# Altium footprint library SOURIAU THD.PcbLib: 34 footprints (part 3 of 5)
Each footprint in its own frame and in the unit in brackets; x right, y up, seen from the top. Pads: shape width x height; smd on the part's side, far side on the other; paste and mask are expansions set on the pad; w line width, h text height; cw(c..) or ccw(c..) is an arc to the next point about the centre after c.
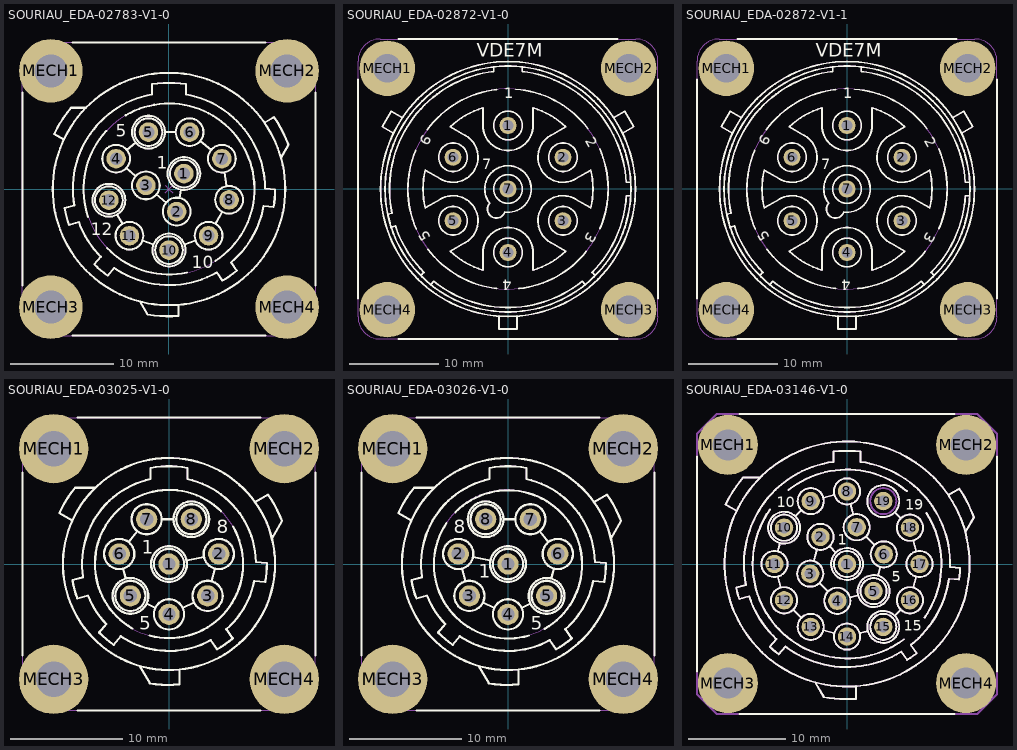
[diagram p2: the footprints below, top view; thin cyan lines are the x and y axes]

## SOURIAU_EDA-02783-V1-0 [mm] "SOURIAU UTO01412P21T Adapter Kit For PCB Mount, 12 Poles, Shell Size 14, UT Bantam Circular Male Connector"
height 33.3
pads (16):
  round 1.9 hole 1.2: 1(1.45,1.5) 2(0.75,-2.2) 3(-2.25,0.35) 4(-5.15,2.95) 5(-2,5.533) 6(2,5.533) 7(5.15,2.95) 8(5.85,-1.05) 9(3.85,-4.55) 10(0,-5.95) 11(-3.85,-4.55) 12(-5.85,-1.09)
  round 6.2 hole 3.2: MECH1(-11.505,11.505) MECH2(11.505,11.505) MECH3(-11.505,-11.505) MECH4(11.505,-11.505)
Top Overlay:
  circle w0.2: c0,0 r11.317
  circle w0.2: c-3.85,-4.55 r1.35
  circle w0.2: c3.85,-4.55 r1.35
  circle w0.2: c5.85,-1.05 r1.35
  circle w0.2: c5.15,2.95 r1.35
  circle w0.2: c2,5.533 r1.35
  circle w0.2: c-5.15,2.95 r1.35
  circle w0.2: c-2.25,0.35 r1.35
  circle w0.2: c0.75,-2.2 r1.35
  circle w0.2: c-5.85,-1.09 r1.35
  circle w0.2: c-5.85,-1.09 r1.6
  circle w0.2: c0,-5.95 r1.35
  circle w0.2: c0,-5.95 r1.6
  circle w0.2: c-2,5.533 r1.35
  circle w0.2: c-2,5.533 r1.6
  circle w0.2: c1.45,1.5 r1.35
  circle w0.2: c1.45,1.5 r1.6
  lines w0.2: -14.285,-9.379 -14.285,9.379 ; -10.239,4.82 -11.176,5.361 cw(c0,0) -9.541,7.913 -8.091,7.913 ; -9.379,-14.285 9.379,-14.285 ; -9.379,14.285 9.379,14.285 ; -7.872,-2.709 cw(c0,0) -6.106,5.659 ; -6.043,-5.727 ccw(c0,0) 1.759,-8.137 ; -5.049,-2.475 -4.526,-3.381 ; -4.212,7.181 cw(c0,0) 4.524,-6.988 ; -4.145,2.049 -3.255,1.251 ; -4.106,3.806 -3.237,4.519 ; -2.807,-10.963 -2.082,-12.219 ccw(c0,0) 0.945,-12.359 0.945,-11.277 ; -2.581,-5.011 -1.504,-5.403 ; -1.221,-0.524 -0.279,-1.326 ; -0.4,5.533 0.65,5.533 ; 1.001,-0.874 1.153,-0.072 ; 1.504,-5.403 2.581,-5.011 ; 3.044,4.677 4.106,3.806 ; 4.52,-3.378 5.18,-2.222 ; 5.383,1.62 5.617,0.28 ; 9.294,6.457 10.231,6.998 cw(c0,0) 11.623,4.306 10.898,3.05 ; 14.285,-9.379 14.285,9.379 ; -10.169,-1.845 ccw(c0,0) -9.729,-3.487 -8.784,-3.234 ccw(c0,0) -6.643,-6.594 -7.272,-7.344 ccw(c0,0) -5.97,-8.437 -5.34,-7.687 ccw(c0,0) 4.65,-8.123 5.212,-8.925 ccw(c0,0) 6.604,-7.95 6.043,-7.148 ccw(c0,0) 9.212,-1.659 10.187,-1.744 ccw(c0,0) 10.335,-0.051 9.36,0.034 ccw(c0,0) 1.65,9.213 1.65,10.202 ccw(c0,0) -1.65,10.202 -1.65,9.213 ccw(c0,0) -9.224,-1.592 -10.169,-1.845
  text "12" at -7.6,-4.5 h1.2
  text "10" at 2.2,-7.7 h1.2
  text "5" at -5.2,5.1 h1.2
  text "1" at -1.172,1.961 h1.2
Mechanical 8:
  lines w0.1: -12.005,-11.505 -11.505,-11.505 ; -12.005,11.505 -11.505,11.505 ; -11.505,-12.005 -11.505,-11.505 ; -11.505,-11.005 -11.505,-11.505 ; -11.505,11.005 -11.505,11.505 ; -11.505,12.005 -11.505,11.505 ; -11.005,-11.505 -11.505,-11.505 ; -11.005,11.505 -11.505,11.505 ; -6.35,-1.09 -5.85,-1.09 ; -5.85,-1.59 -5.85,-1.09 ; -5.85,-0.59 -5.85,-1.09 ; -5.65,2.95 -5.15,2.95 ; -5.35,-1.09 -5.85,-1.09 ; -5.15,2.45 -5.15,2.95 ; -5.15,3.45 -5.15,2.95 ; -4.65,2.95 -5.15,2.95 ; -4.35,-4.55 -3.85,-4.55 ; -3.85,-5.05 -3.85,-4.55 ; -3.85,-4.05 -3.85,-4.55 ; -3.35,-4.55 -3.85,-4.55 ; -2.75,0.35 -2.25,0.35 ; -2.5,5.533 -2,5.533 ; -2.25,-0.15 -2.25,0.35 ; -2.25,0.85 -2.25,0.35 ; -2,5.033 -2,5.533 ; -2,6.033 -2,5.533 ; -1.75,0.35 -2.25,0.35 ; -1.5,5.533 -2,5.533 ; -0.5,-5.95 0,-5.95 ; -0.354,-0.354 0,0 ; -0.354,0.354 0,0 ; 0,-6.45 0,-5.95 ; 0,-5.45 0,-5.95 ; 0.25,-2.2 0.75,-2.2 ; 0.354,-0.354 0,0 ; 0.354,0.354 0,0 ; 0.5,-5.95 0,-5.95 ; 0.75,-2.7 0.75,-2.2 ; 0.75,-1.7 0.75,-2.2 ; 0.95,1.5 1.45,1.5 ; 1.25,-2.2 0.75,-2.2 ; 1.45,1 1.45,1.5 ; 1.45,2 1.45,1.5 ; 1.5,5.533 2,5.533 ; 1.95,1.5 1.45,1.5 ; 2,5.033 2,5.533 ; 2,6.033 2,5.533 ; 2.5,5.533 2,5.533 ; 3.35,-4.55 3.85,-4.55 ; 3.85,-5.05 3.85,-4.55 ; 3.85,-4.05 3.85,-4.55 ; 4.35,-4.55 3.85,-4.55 ; 4.65,2.95 5.15,2.95 ; 5.15,2.45 5.15,2.95 ; 5.15,3.45 5.15,2.95 ; 5.35,-1.05 5.85,-1.05 ; 5.65,2.95 5.15,2.95 ; 5.85,-1.55 5.85,-1.05 ; 5.85,-0.55 5.85,-1.05 ; 6.35,-1.05 5.85,-1.05 ; 11.005,-11.505 11.505,-11.505 ; 11.005,11.505 11.505,11.505 ; 11.505,-12.005 11.505,-11.505 ; 11.505,-11.005 11.505,-11.505 ; 11.505,11.005 11.505,11.505 ; 11.505,12.005 11.505,11.505 ; 12.005,-11.505 11.505,-11.505 ; 12.005,11.505 11.505,11.505
Mechanical 14:
  circle w0.1: c-3.85,-4.55 r1.35
  circle w0.1: c3.85,-4.55 r1.35
  circle w0.1: c5.85,-1.05 r1.35
  circle w0.1: c5.15,2.95 r1.35
  circle w0.1: c2,5.533 r1.35
  circle w0.1: c-5.15,2.95 r1.35
  circle w0.1: c-2.25,0.35 r1.35
  circle w0.1: c0.75,-2.2 r1.35
  circle w0.1: c-5.85,-1.09 r1.6
  circle w0.1: c-5.85,-1.09 r1.35
  circle w0.1: c0,-5.95 r1.6
  circle w0.1: c0,-5.95 r1.35
  circle w0.1: c-2,5.533 r1.6
  circle w0.1: c-2,5.533 r1.35
  circle w0.1: c1.45,1.5 r1.6
  circle w0.1: c1.45,1.5 r1.35
  circle w0.1: c0,0 r8.325
  circle w0.1: c0,0 r11.317
  circle w0.1: c-11.505,-11.505 r2.8
  circle w0.1: c11.505,-11.505 r2.8
  circle w0.1: c11.505,11.505 r2.8
  circle w0.1: c-11.505,11.505 r2.8
  lines w0.1: -14.285,-11.839 -14.285,-12.603 -13.844,-13.044 ; -14.285,-11.171 -14.285,11.171 ; -14.285,11.839 -14.285,12.603 -13.844,13.044 ; -13.044,-13.844 -12.603,-14.285 -11.839,-14.285 ; -13.044,13.844 -12.603,14.285 -11.839,14.285 ; -11.171,-14.285 11.171,-14.285 ; -11.171,14.285 11.171,14.285 ; -10.239,4.82 -11.176,5.361 cw(c0,0) -9.541,7.913 -8.091,7.913 ; -5.049,-2.475 -4.526,-3.381 ; -4.145,2.049 -3.255,1.251 ; -4.106,3.806 -3.237,4.519 ; -2.807,-10.963 -2.082,-12.219 ccw(c0,0) 0.945,-12.359 0.945,-11.277 ; -2.581,-5.011 -1.504,-5.403 ; -1.221,-0.524 -0.279,-1.326 ; -0.4,5.533 0.65,5.533 ; 1.001,-0.874 1.153,-0.072 ; 1.504,-5.403 2.581,-5.011 ; 3.044,4.677 4.106,3.806 ; 4.52,-3.378 5.18,-2.222 ; 5.383,1.62 5.617,0.28 ; 9.294,6.457 10.231,6.998 cw(c0,0) 11.623,4.306 10.898,3.05 ; 11.839,-14.285 12.603,-14.285 13.044,-13.844 ; 11.839,14.285 12.603,14.285 13.044,13.844 ; 13.844,-13.044 14.285,-12.603 14.285,-11.839 ; 13.844,13.044 14.285,12.603 14.285,11.839 ; 14.285,-11.171 14.285,11.171 ; -12.667,-11.861 ccw(c-12.475,-12.065) -12.395,-12.333 cw(c-12.254,-12.803) -11.777,-12.69 ccw(c-11.505,-12.625) -11.233,-12.69 cw(c-10.756,-12.803) -10.615,-12.333 ccw(c-10.535,-12.065) -10.343,-11.861 cw(c-10.007,-11.505) -10.343,-11.149 ccw(c-10.535,-10.945) -10.615,-10.677 cw(c-10.756,-10.207) -11.233,-10.32 ccw(c-11.505,-10.385) -11.777,-10.32 cw(c-12.254,-10.207) -12.395,-10.677 ccw(c-12.475,-10.945) -12.667,-11.149 cw(c-13.003,-11.505) -12.667,-11.861 ; -12.667,11.149 ccw(c-12.475,10.945) -12.395,10.677 cw(c-12.254,10.207) -11.777,10.32 ccw(c-11.505,10.385) -11.233,10.32 cw(c-10.756,10.207) -10.615,10.677 ccw(c-10.535,10.945) -10.343,11.149 cw(c-10.007,11.505) -10.343,11.861 ccw(c-10.535,12.065) -10.615,12.333 cw(c-10.756,12.803) -11.233,12.69 ccw(c-11.505,12.625) -11.777,12.69 cw(c-12.254,12.803) -12.395,12.333 ccw(c-12.475,12.065) -12.667,11.861 cw(c-13.003,11.505) -12.667,11.149 ; -10.169,-1.845 ccw(c0,0) -9.729,-3.487 -8.784,-3.234 ccw(c0,0) -6.643,-6.594 -7.272,-7.344 ccw(c0,0) -5.97,-8.437 -5.34,-7.687 ccw(c0,0) 4.65,-8.123 5.212,-8.925 ccw(c0,0) 6.604,-7.95 6.043,-7.148 ccw(c0,0) 9.212,-1.659 10.187,-1.744 ccw(c0,0) 10.335,-0.051 9.36,0.034 ccw(c0,0) 1.65,9.213 1.65,10.202 ccw(c0,0) -1.65,10.202 -1.65,9.213 ccw(c0,0) -9.224,-1.592 -10.169,-1.845 ; 10.343,-11.861 ccw(c10.535,-12.065) 10.615,-12.333 cw(c10.756,-12.803) 11.233,-12.69 ccw(c11.505,-12.625) 11.777,-12.69 cw(c12.254,-12.803) 12.395,-12.333 ccw(c12.475,-12.065) 12.667,-11.861 cw(c13.003,-11.505) 12.667,-11.149 ccw(c12.475,-10.945) 12.395,-10.677 cw(c12.254,-10.207) 11.777,-10.32 ccw(c11.505,-10.385) 11.233,-10.32 cw(c10.756,-10.207) 10.615,-10.677 ccw(c10.535,-10.945) 10.343,-11.149 cw(c10.007,-11.505) 10.343,-11.861 ; 10.343,11.149 ccw(c10.535,10.945) 10.615,10.677 cw(c10.756,10.207) 11.233,10.32 ccw(c11.505,10.385) 11.777,10.32 cw(c12.254,10.207) 12.395,10.677 ccw(c12.475,10.945) 12.667,11.149 cw(c13.003,11.505) 12.667,11.861 ccw(c12.475,12.065) 12.395,12.333 cw(c12.254,12.803) 11.777,12.69 ccw(c11.505,12.625) 11.233,12.69 cw(c10.756,12.803) 10.615,12.333 ccw(c10.535,12.065) 10.343,11.861 cw(c10.007,11.505) 10.343,11.149
  text "11" at -4.45,-5.15 h1.2
  text "9" at 3.479,-5.15 h1.2
  text "8" at 5.45,-1.65 h1.2
  text "7" at 4.75,2.35 h1.2
  text "6" at 1.629,4.933 h1.2
  text "4" at -5.579,2.35 h1.2
  text "3" at -2.65,-0.25 h1.2
  text "2" at 0.35,-2.8 h1.2
  text "12" at -6.707,-1.69 h1.2
  text "10" at -0.857,-6.55 h1.2
  text "5" at -2.4,4.933 h1.2
  text "1" at 1.307,0.9 h1.2
3D body "SOURIAU_EDA-02783-V1-0.stp": height 32.93, standoff -14.87, extent -14.605,-14.598 14.605,14.599

## SOURIAU_EDA-02872-V1-0 [mm] "SOURIAU UTG0187PVDEX Connector VDE 7 Male Contacts Mounted On 20mm M3 Spacer"
height 40.75
pads (11):
  round 1.9 hole 1.2: 1(0,7.1) 2(6.149,3.55) 3(6.149,-3.55) 4(0,-7.1) 5(-6.149,-3.55) 6(-6.149,3.55) 7(0,0)
  round 6.2 hole 3.2: MECH1(-13.5,13.5) MECH2(13.5,13.5) MECH3(13.5,-13.5) MECH4(-13.5,-13.5)
Top Overlay:
  circle w0.2: c0,0 r13.75
  circle w0.2: c0,0 r14.25
  circle w0.2: c-6.149,3.55 r1.6
  circle w0.2: c0,7.1 r1.6
  circle w0.2: c6.149,3.55 r1.6
  circle w0.2: c0,0 r1.6
  circle w0.2: c6.149,-3.55 r1.6
  circle w0.2: c0,-7.1 r1.6
  circle w0.2: c-6.149,-3.55 r1.6
  lines w0.2: -16.775,-12.265 -16.775,12.265 ; -13.456,-2.829 -12.972,-2.699 cw(c0,0) -1.6,13.153 -1.6,13.657 ; -13.068,-4.278 -12.584,-4.148 ccw(c0,0) -9.409,-9.329 -9.744,-9.701 ; -12.81,6.241 -14.053,6.959 -13.053,8.691 -11.81,7.973 ; -12.265,-16.775 12.265,-16.775 ; -12.265,16.775 12.265,16.775 ; -10.332,4.324 ccw(c0,0) -10.265,-4.48 ; -9.034,6.62 cw(c0,0) -1.262,11.129 ; -8.951,-6.732 ccw(c0,0) -1.262,-11.129 ; -8.629,-10.705 -8.294,-10.333 ccw(c0,0) 8.294,-10.333 8.629,-10.705 ; -1,-14.215 -1,-15.65 1,-15.65 1,-14.215 ; 0.875,11.166 cw(c0,0) 8.921,6.772 ; 1.229,-11.132 ccw(c0,0) 8.761,-6.977 ; 1.6,13.657 1.6,13.153 cw(c0,0) 13.229,0.75 13.73,0.75 ; 9.744,-9.701 9.409,-9.329 ccw(c0,0) 13.229,-0.75 13.73,-0.75 ; 10.254,4.506 cw(c0,0) 10.292,-4.418 ; 11.81,7.973 13.053,8.691 14.053,6.959 12.81,6.241 ; 16.775,-12.265 16.775,12.265 ; -9.262,-2.114 cw(c0,0) -9.262,2.114 -7.549,1.125 ccw(c-6.149,3.55) -4.749,5.975 -6.462,6.964 cw(c0,0) -2.8,9.078 -2.8,7.1 ccw(c0,7.1) 2.8,7.1 2.8,9.078 cw(c0,0) 6.462,6.964 4.749,5.975 ccw(c6.149,3.55) 7.549,1.125 9.262,2.114 cw(c0,0) 9.262,-2.114 7.549,-1.125 ccw(c6.149,-3.55) 4.749,-5.975 6.462,-6.964 cw(c0,0) 2.8,-9.078 2.8,-7.1 ccw(c0,-7.1) -2.8,-7.1 -2.8,-9.078 cw(c0,0) -6.462,-6.964 -4.749,-5.975 ccw(c-6.149,-3.55) -7.549,-1.125 -9.262,-2.114 ; -2.054,-1.594 cw(c0,0) -0.354,-2.576 cw(c-1.3,-2.252) -2.054,-1.594
  text "7" at -2.9,2.2 h1.2
  text "6" at -8.975,4.703 h1.2
  text "5" at -8.56,-5.421 h1.2
  text "4" at 0.415,-10.124 h1.2
  text "3" at 8.975,-4.703 h1.2
  text "2" at 8.56,5.421 h1.2
  text "1" at -0.415,10.124 h1.2
  text "VDE7M" at -3.5,14.8 h1.5
Mechanical 8:
  lines w0.1: -14,-13.5 -13.5,-13.5 ; -14,13.5 -13.5,13.5 ; -13.5,-14 -13.5,-13.5 ; -13.5,-13 -13.5,-13.5 ; -13.5,13 -13.5,13.5 ; -13.5,14 -13.5,13.5 ; -13,-13.5 -13.5,-13.5 ; -13,13.5 -13.5,13.5 ; -6.582,-3.8 -6.149,-3.55 ; -6.582,3.8 -6.149,3.55 ; -6.399,-3.117 -6.149,-3.55 ; -6.399,3.117 -6.149,3.55 ; -5.899,-3.983 -6.149,-3.55 ; -5.899,3.983 -6.149,3.55 ; -5.716,-3.3 -6.149,-3.55 ; -5.716,3.3 -6.149,3.55 ; -0.5,-7.1 0,-7.1 ; -0.5,0 0,0 ; -0.5,7.1 0,7.1 ; 0,-7.6 0,-7.1 ; 0,-6.6 0,-7.1 ; 0,-0.5 0,0 ; 0,0.5 0,0 ; 0,6.6 0,7.1 ; 0,7.6 0,7.1 ; 0.5,-7.1 0,-7.1 ; 0.5,0 0,0 ; 0.5,7.1 0,7.1 ; 5.716,-3.3 6.149,-3.55 ; 5.716,3.3 6.149,3.55 ; 5.899,-3.983 6.149,-3.55 ; 5.899,3.983 6.149,3.55 ; 6.399,-3.117 6.149,-3.55 ; 6.399,3.117 6.149,3.55 ; 6.582,-3.8 6.149,-3.55 ; 6.582,3.8 6.149,3.55 ; 13,-13.5 13.5,-13.5 ; 13,13.5 13.5,13.5 ; 13.5,-14 13.5,-13.5 ; 13.5,-13 13.5,-13.5 ; 13.5,13 13.5,13.5 ; 13.5,14 13.5,13.5 ; 14,-13.5 13.5,-13.5 ; 14,13.5 13.5,13.5
Mechanical 14:
  circle w0.1: c0,0 r11.2
  circle w0.1: c0,0 r13.75
  circle w0.1: c0,0 r14.25
  circle w0.1: c-6.149,3.55 r1.6
  circle w0.1: c0,7.1 r1.6
  circle w0.1: c6.149,3.55 r1.6
  circle w0.1: c0,0 r1.6
  circle w0.1: c6.149,-3.55 r1.6
  circle w0.1: c0,-7.1 r1.6
  circle w0.1: c-6.149,-3.55 r1.6
  circle w0.1: c-13.5,13.5 r2.8
  circle w0.1: c13.5,13.5 r2.8
  circle w0.1: c-13.5,-13.5 r2.8
  circle w0.1: c13.5,-13.5 r2.8
  lines w0.1: -13.456,-2.829 -12.972,-2.699 cw(c0,0) -1.6,13.153 -1.6,13.657 ; -13.235,-12.291 ccw(c-13.501,-12.382) -13.78,-12.343 cw(c-14.249,-12.202) -14.39,-12.672 ccw(c-14.47,-12.941) -14.642,-13.164 cw(c-14.998,-13.5) -14.662,-13.856 ccw(c-14.47,-14.06) -14.39,-14.328 cw(c-14.249,-14.798) -13.772,-14.685 ccw(c-13.5,-14.62) -13.222,-14.657 ; -13.235,14.709 ccw(c-13.501,14.618) -13.78,14.657 cw(c-14.249,14.798) -14.39,14.328 ccw(c-14.47,14.059) -14.642,13.836 cw(c-14.998,13.5) -14.662,13.144 ccw(c-14.47,12.94) -14.39,12.672 cw(c-14.249,12.202) -13.772,12.315 ccw(c-13.5,12.38) -13.222,12.343 ; -13.228,-12.315 ccw(c-12.751,-12.202) -12.638,-12.679 ; -13.228,14.685 ccw(c-12.751,14.798) -12.638,14.321 ; -13.22,-14.657 cw(c-12.755,-14.794) -12.577,-14.343 ; -13.22,12.343 cw(c-12.755,12.206) -12.577,12.657 ; -13.068,-4.278 -12.584,-4.148 ccw(c0,0) -9.409,-9.329 -9.744,-9.701 ; -12.81,6.241 -14.053,6.959 -13.053,8.691 -11.81,7.973 ; -12.637,-12.681 cw(c-12.53,-12.94) -12.32,-13.125 ; -12.637,14.319 cw(c-12.53,14.06) -12.32,13.875 ; -12.586,-14.334 ccw(c-12.531,-14.058) -12.358,-13.836 cw(c-12.002,-13.5) -12.35,-13.155 ; -12.586,12.666 ccw(c-12.531,12.942) -12.358,13.164 cw(c-12.002,13.5) -12.35,13.845 ; -8.629,-10.705 -8.294,-10.333 ccw(c0,0) 8.294,-10.333 8.629,-10.705 ; -1,-14.215 -1,-15.65 1,-15.65 1,-14.215 ; 1.6,13.657 1.6,13.153 cw(c0,0) 13.229,0.75 13.73,0.75 ; 9.744,-9.701 9.409,-9.329 ccw(c0,0) 13.229,-0.75 13.73,-0.75 ; 11.81,7.973 13.053,8.691 14.053,6.959 12.81,6.241 ; 13.765,-12.291 ccw(c13.499,-12.382) 13.22,-12.343 cw(c12.751,-12.202) 12.61,-12.672 ccw(c12.53,-12.941) 12.358,-13.164 cw(c12.002,-13.5) 12.338,-13.856 ccw(c12.53,-14.06) 12.61,-14.328 cw(c12.751,-14.798) 13.228,-14.685 ccw(c13.5,-14.62) 13.778,-14.657 ; 13.765,14.709 ccw(c13.499,14.618) 13.22,14.657 cw(c12.751,14.798) 12.61,14.328 ccw(c12.53,14.059) 12.358,13.836 cw(c12.002,13.5) 12.338,13.144 ccw(c12.53,12.94) 12.61,12.672 cw(c12.751,12.202) 13.228,12.315 ccw(c13.5,12.38) 13.778,12.343 ; 13.772,-12.315 ccw(c14.249,-12.202) 14.362,-12.679 ; 13.772,14.685 ccw(c14.249,14.798) 14.362,14.321 ; 13.78,-14.657 cw(c14.245,-14.794) 14.423,-14.343 ; 13.78,12.343 cw(c14.245,12.206) 14.423,12.657 ; 14.363,-12.681 cw(c14.47,-12.94) 14.68,-13.125 ; 14.363,14.319 cw(c14.47,14.06) 14.68,13.875 ; 14.414,-14.334 ccw(c14.469,-14.058) 14.642,-13.836 cw(c14.998,-13.5) 14.65,-13.155 ; 14.414,12.666 ccw(c14.469,12.942) 14.642,13.164 cw(c14.998,13.5) 14.65,13.845 ; -16.775,-14.275 ccw(c-14.275,-14.275) -14.275,-16.775 14.275,-16.775 ccw(c14.275,-14.275) 16.775,-14.275 16.775,14.275 ccw(c14.275,14.275) 14.275,16.775 -14.275,16.775 ccw(c-14.275,14.275) -16.775,14.275 -16.775,-14.275 ; -9.262,-2.114 cw(c0,0) -9.262,2.114 -7.549,1.125 ccw(c-6.149,3.55) -4.749,5.975 -6.462,6.964 cw(c0,0) -2.8,9.078 -2.8,7.1 ccw(c0,7.1) 2.8,7.1 2.8,9.078 cw(c0,0) 6.462,6.964 4.749,5.975 ccw(c6.149,3.55) 7.549,1.125 9.262,2.114 cw(c0,0) 9.262,-2.114 7.549,-1.125 ccw(c6.149,-3.55) 4.749,-5.975 6.462,-6.964 cw(c0,0) 2.8,-9.078 2.8,-7.1 ccw(c0,-7.1) -2.8,-7.1 -2.8,-9.078 cw(c0,0) -6.462,-6.964 -4.749,-5.975 ccw(c-6.149,-3.55) -7.549,-1.125 -9.262,-2.114 ; -2.054,-1.594 cw(c0,0) -0.354,-2.576 cw(c-1.3,-2.252) -2.054,-1.594
  text "7" at -0.667,-1 h2
  text "1" at -0.238,6.1 h2
  text "2" at 5.482,2.55 h2
  text "3" at 5.482,-4.55 h2
  text "4" at -0.714,-8.1 h2
  text "5" at -6.815,-4.55 h2
  text "6" at -6.768,2.55 h2
  text "7" at -0.667,-1 h2
  text "VDE7M" at -3.5,14.8 h1.5
3D body "SOURIAU_EDA-02872-V1-0.stp": height 40.6, standoff -7.9, extent -16.775,-16.775 16.775,16.775

## SOURIAU_EDA-02872-V1-1 [mm] "SOURIAU UTG0187PVDEX Connector VDE 7 Male Contacts Mounted On 20mm M3 Spacer"
height 35.75
pads (11):
  round 1.9 hole 1.2: 1(0,7.1) 2(6.149,3.55) 3(6.149,-3.55) 4(0,-7.1) 5(-6.149,-3.55) 6(-6.149,3.55) 7(0,0)
  round 6.2 hole 3.2: MECH1(-13.5,13.5) MECH2(13.5,13.5) MECH3(13.5,-13.5) MECH4(-13.5,-13.5)
Top Overlay:
  circle w0.2: c-6.149,-3.55 r1.6
  circle w0.2: c0,-7.1 r1.6
  circle w0.2: c6.149,-3.55 r1.6
  circle w0.2: c0,0 r1.6
  circle w0.2: c6.149,3.55 r1.6
  circle w0.2: c0,7.1 r1.6
  circle w0.2: c-6.149,3.55 r1.6
  circle w0.2: c0,0 r14.25
  circle w0.2: c0,0 r13.75
  lines w0.2: -16.775,-12.265 -16.775,12.265 ; -13.456,-2.829 -12.972,-2.699 cw(c0,0) -1.6,13.153 -1.6,13.657 ; -13.068,-4.278 -12.584,-4.148 ccw(c0,0) -9.409,-9.329 -9.744,-9.701 ; -12.81,6.241 -14.053,6.959 -13.053,8.691 -11.81,7.973 ; -12.265,-16.775 12.265,-16.775 ; -12.265,16.775 12.265,16.775 ; -10.332,4.324 ccw(c0,0) -10.265,-4.48 ; -9.034,6.62 cw(c0,0) -1.262,11.129 ; -8.951,-6.732 ccw(c0,0) -1.262,-11.129 ; -8.629,-10.705 -8.294,-10.333 ccw(c0,0) 8.294,-10.333 8.629,-10.705 ; -1,-14.215 -1,-15.65 1,-15.65 1,-14.215 ; 0.875,11.166 cw(c0,0) 8.921,6.772 ; 1.229,-11.132 ccw(c0,0) 8.761,-6.977 ; 1.6,13.657 1.6,13.153 cw(c0,0) 13.229,0.75 13.73,0.75 ; 9.744,-9.701 9.409,-9.329 ccw(c0,0) 13.229,-0.75 13.73,-0.75 ; 10.254,4.506 cw(c0,0) 10.292,-4.418 ; 11.81,7.973 13.053,8.691 14.053,6.959 12.81,6.241 ; 16.775,-12.265 16.775,12.265 ; -9.262,-2.114 cw(c0,0) -9.262,2.114 -7.549,1.125 ccw(c-6.149,3.55) -4.749,5.975 -6.462,6.964 cw(c0,0) -2.8,9.078 -2.8,7.1 ccw(c0,7.1) 2.8,7.1 2.8,9.078 cw(c0,0) 6.462,6.964 4.749,5.975 ccw(c6.149,3.55) 7.549,1.125 9.262,2.114 cw(c0,0) 9.262,-2.114 7.549,-1.125 ccw(c6.149,-3.55) 4.749,-5.975 6.462,-6.964 cw(c0,0) 2.8,-9.078 2.8,-7.1 ccw(c0,-7.1) -2.8,-7.1 -2.8,-9.078 cw(c0,0) -6.462,-6.964 -4.749,-5.975 ccw(c-6.149,-3.55) -7.549,-1.125 -9.262,-2.114 ; -2.054,-1.594 ccw(c-1.3,-2.252) -0.354,-2.576 ccw(c0,0) -2.054,-1.594
  text "VDE7M" at -3.5,14.8 h1.5
  text "1" at -0.415,10.124 h1.2
  text "2" at 8.56,5.421 h1.2
  text "3" at 8.975,-4.703 h1.2
  text "4" at 0.415,-10.124 h1.2
  text "5" at -8.56,-5.421 h1.2
  text "6" at -8.975,4.703 h1.2
  text "7" at -2.9,2.2 h1.2
Mechanical 8:
  lines w0.1: -14,-13.5 -13.5,-13.5 ; -14,13.5 -13.5,13.5 ; -13.5,-14 -13.5,-13.5 ; -13.5,-13 -13.5,-13.5 ; -13.5,13 -13.5,13.5 ; -13.5,14 -13.5,13.5 ; -13,-13.5 -13.5,-13.5 ; -13,13.5 -13.5,13.5 ; -6.582,-3.8 -6.149,-3.55 ; -6.582,3.8 -6.149,3.55 ; -6.399,-3.117 -6.149,-3.55 ; -6.399,3.117 -6.149,3.55 ; -5.899,-3.983 -6.149,-3.55 ; -5.899,3.983 -6.149,3.55 ; -5.716,-3.3 -6.149,-3.55 ; -5.716,3.3 -6.149,3.55 ; -0.5,-7.1 0,-7.1 ; -0.5,0 0,0 ; -0.5,7.1 0,7.1 ; 0,-7.6 0,-7.1 ; 0,-6.6 0,-7.1 ; 0,-0.5 0,0 ; 0,0.5 0,0 ; 0,6.6 0,7.1 ; 0,7.6 0,7.1 ; 0.5,-7.1 0,-7.1 ; 0.5,0 0,0 ; 0.5,7.1 0,7.1 ; 5.716,-3.3 6.149,-3.55 ; 5.716,3.3 6.149,3.55 ; 5.899,-3.983 6.149,-3.55 ; 5.899,3.983 6.149,3.55 ; 6.399,-3.117 6.149,-3.55 ; 6.399,3.117 6.149,3.55 ; 6.582,-3.8 6.149,-3.55 ; 6.582,3.8 6.149,3.55 ; 13,-13.5 13.5,-13.5 ; 13,13.5 13.5,13.5 ; 13.5,-14 13.5,-13.5 ; 13.5,-13 13.5,-13.5 ; 13.5,13 13.5,13.5 ; 13.5,14 13.5,13.5 ; 14,-13.5 13.5,-13.5 ; 14,13.5 13.5,13.5
Mechanical 14:
  circle w0.1: c13.5,-13.5 r2.8
  circle w0.1: c-13.5,-13.5 r2.8
  circle w0.1: c13.5,13.5 r2.8
  circle w0.1: c-13.5,13.5 r2.8
  circle w0.1: c-6.149,-3.55 r1.6
  circle w0.1: c0,-7.1 r1.6
  circle w0.1: c6.149,-3.55 r1.6
  circle w0.1: c0,0 r1.6
  circle w0.1: c6.149,3.55 r1.6
  circle w0.1: c0,7.1 r1.6
  circle w0.1: c-6.149,3.55 r1.6
  circle w0.1: c0,0 r14.25
  circle w0.1: c0,0 r13.75
  circle w0.1: c0,0 r11.2
  lines w0.1: -13.456,-2.829 -12.972,-2.699 cw(c0,0) -1.6,13.153 -1.6,13.657 ; -13.235,-12.291 ccw(c-13.501,-12.382) -13.78,-12.343 cw(c-14.249,-12.202) -14.39,-12.672 ccw(c-14.47,-12.941) -14.642,-13.164 cw(c-14.998,-13.5) -14.662,-13.856 ccw(c-14.47,-14.06) -14.39,-14.328 cw(c-14.249,-14.798) -13.772,-14.685 ccw(c-13.5,-14.62) -13.222,-14.657 ; -13.235,14.709 ccw(c-13.501,14.618) -13.78,14.657 cw(c-14.249,14.798) -14.39,14.328 ccw(c-14.47,14.059) -14.642,13.836 cw(c-14.998,13.5) -14.662,13.144 ccw(c-14.47,12.94) -14.39,12.672 cw(c-14.249,12.202) -13.772,12.315 ccw(c-13.5,12.38) -13.222,12.343 ; -13.228,-12.315 ccw(c-12.751,-12.202) -12.638,-12.679 ; -13.228,14.685 ccw(c-12.751,14.798) -12.638,14.321 ; -13.22,-14.657 cw(c-12.755,-14.794) -12.577,-14.343 ; -13.22,12.343 cw(c-12.755,12.206) -12.577,12.657 ; -13.068,-4.278 -12.584,-4.148 ccw(c0,0) -9.409,-9.329 -9.744,-9.701 ; -12.81,6.241 -14.053,6.959 -13.053,8.691 -11.81,7.973 ; -12.637,-12.681 cw(c-12.53,-12.94) -12.32,-13.125 ; -12.637,14.319 cw(c-12.53,14.06) -12.32,13.875 ; -12.586,-14.334 ccw(c-12.531,-14.058) -12.358,-13.836 cw(c-12.002,-13.5) -12.35,-13.155 ; -12.586,12.666 ccw(c-12.531,12.942) -12.358,13.164 cw(c-12.002,13.5) -12.35,13.845 ; -8.629,-10.705 -8.294,-10.333 ccw(c0,0) 8.294,-10.333 8.629,-10.705 ; -1,-14.215 -1,-15.65 1,-15.65 1,-14.215 ; 1.6,13.657 1.6,13.153 cw(c0,0) 13.229,0.75 13.73,0.75 ; 9.744,-9.701 9.409,-9.329 ccw(c0,0) 13.229,-0.75 13.73,-0.75 ; 11.81,7.973 13.053,8.691 14.053,6.959 12.81,6.241 ; 13.765,-12.291 ccw(c13.499,-12.382) 13.22,-12.343 cw(c12.751,-12.202) 12.61,-12.672 ccw(c12.53,-12.941) 12.358,-13.164 cw(c12.002,-13.5) 12.338,-13.856 ccw(c12.53,-14.06) 12.61,-14.328 cw(c12.751,-14.798) 13.228,-14.685 ccw(c13.5,-14.62) 13.778,-14.657 ; 13.765,14.709 ccw(c13.499,14.618) 13.22,14.657 cw(c12.751,14.798) 12.61,14.328 ccw(c12.53,14.059) 12.358,13.836 cw(c12.002,13.5) 12.338,13.144 ccw(c12.53,12.94) 12.61,12.672 cw(c12.751,12.202) 13.228,12.315 ccw(c13.5,12.38) 13.778,12.343 ; 13.772,-12.315 ccw(c14.249,-12.202) 14.362,-12.679 ; 13.772,14.685 ccw(c14.249,14.798) 14.362,14.321 ; 13.78,-14.657 cw(c14.245,-14.794) 14.423,-14.343 ; 13.78,12.343 cw(c14.245,12.206) 14.423,12.657 ; 14.363,-12.681 cw(c14.47,-12.94) 14.68,-13.125 ; 14.363,14.319 cw(c14.47,14.06) 14.68,13.875 ; 14.414,-14.334 ccw(c14.469,-14.058) 14.642,-13.836 cw(c14.998,-13.5) 14.65,-13.155 ; 14.414,12.666 ccw(c14.469,12.942) 14.642,13.164 cw(c14.998,13.5) 14.65,13.845 ; -16.775,-14.275 ccw(c-14.275,-14.275) -14.275,-16.775 14.275,-16.775 ccw(c14.275,-14.275) 16.775,-14.275 16.775,14.275 ccw(c14.275,14.275) 14.275,16.775 -14.275,16.775 ccw(c-14.275,14.275) -16.775,14.275 -16.775,-14.275 ; -9.262,-2.114 cw(c0,0) -9.262,2.114 -7.549,1.125 ccw(c-6.149,3.55) -4.749,5.975 -6.462,6.964 cw(c0,0) -2.8,9.078 -2.8,7.1 ccw(c0,7.1) 2.8,7.1 2.8,9.078 cw(c0,0) 6.462,6.964 4.749,5.975 ccw(c6.149,3.55) 7.549,1.125 9.262,2.114 cw(c0,0) 9.262,-2.114 7.549,-1.125 ccw(c6.149,-3.55) 4.749,-5.975 6.462,-6.964 cw(c0,0) 2.8,-9.078 2.8,-7.1 ccw(c0,-7.1) -2.8,-7.1 -2.8,-9.078 cw(c0,0) -6.462,-6.964 -4.749,-5.975 ccw(c-6.149,-3.55) -7.549,-1.125 -9.262,-2.114 ; -2.054,-1.594 ccw(c-1.3,-2.252) -0.354,-2.576 ccw(c0,0) -2.054,-1.594